# Altium footprint library smd-ipc.PCBLIB: 363 footprints (part 12 of 27)
Each footprint in its own frame and in the unit in brackets; x right, y up, seen from the top. Pads: shape width x height; smd on the part's side, far side on the other; paste and mask are expansions set on the pad; w line width, h text height; cw(c..) or ccw(c..) is an arc to the next point about the centre after c.
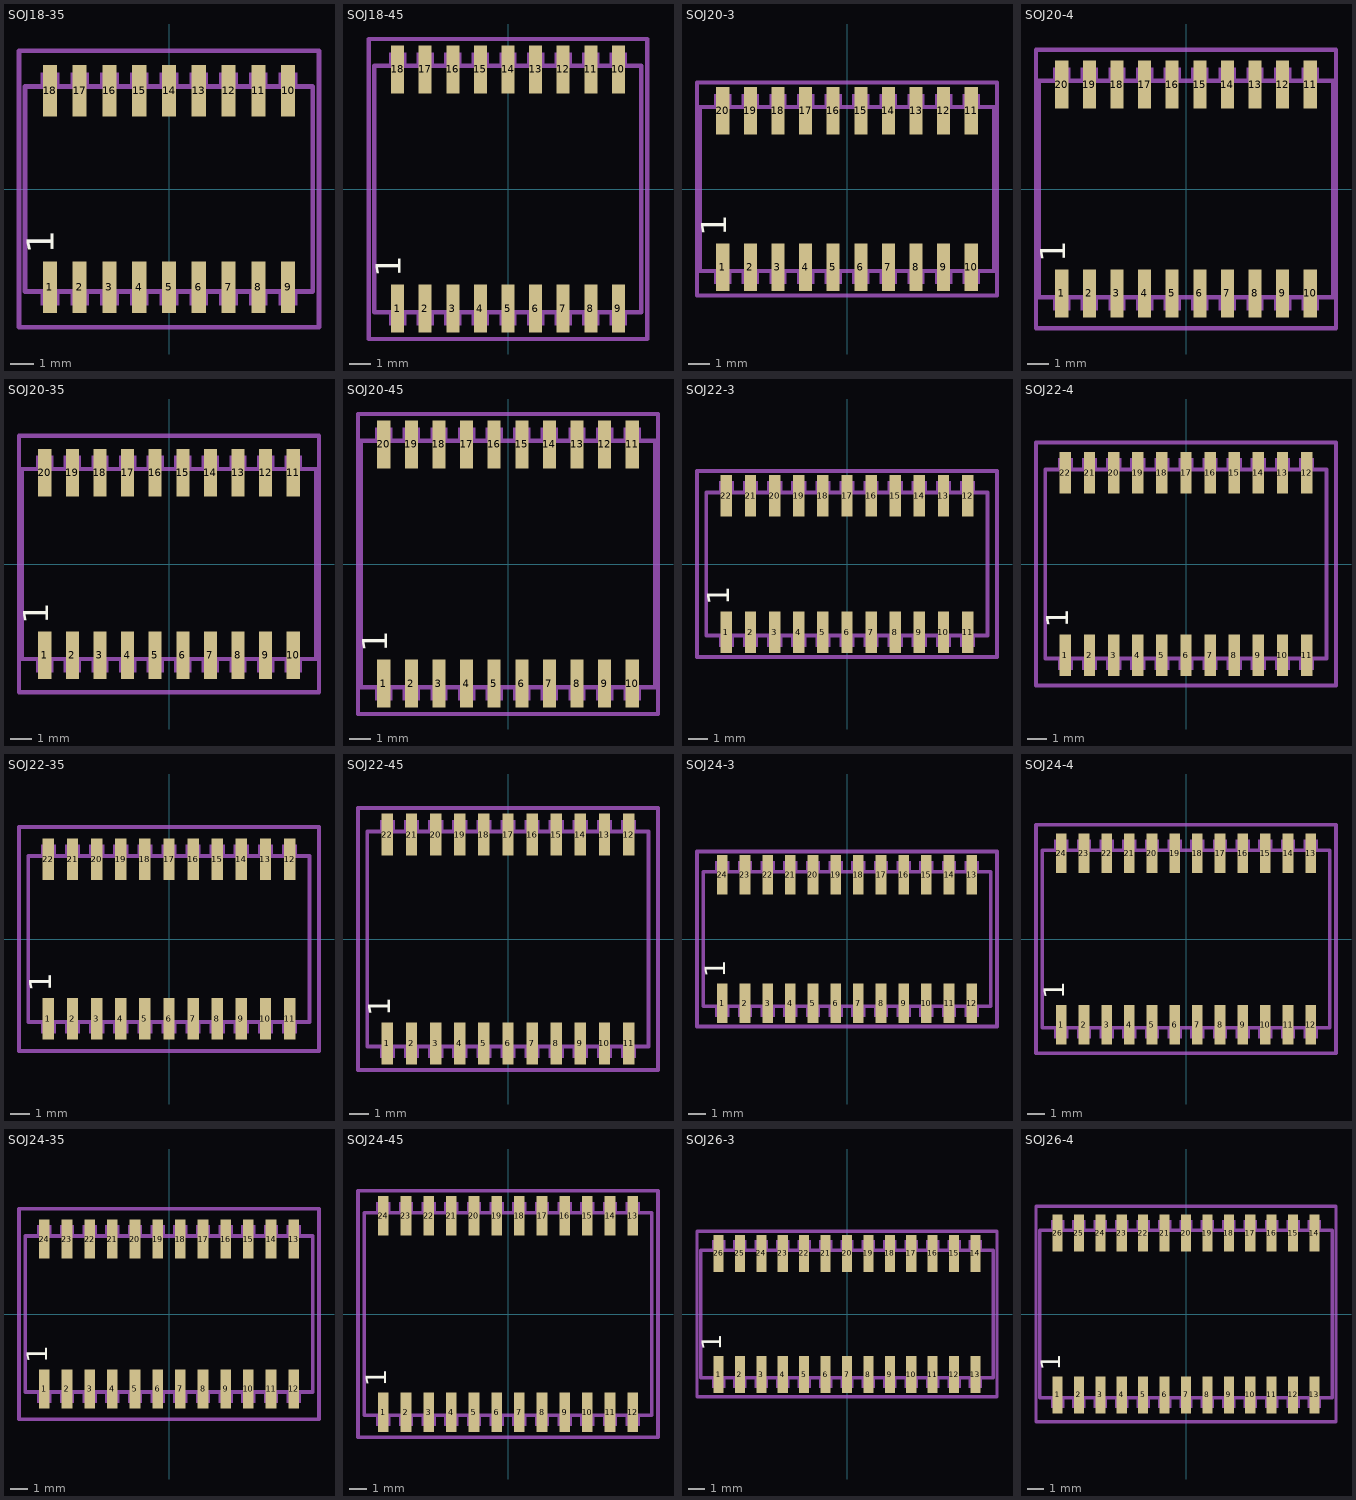
[diagram p11: the footprints below, top view; thin cyan lines are the x and y axes]

## SOJ18-35 [mm]
pads (18):
  rect 0.6x2.2 smd: 1(-5.08,-4.2) 2(-3.81,-4.2) 3(-2.54,-4.2) 4(-1.27,-4.2) 5(0,-4.2) 6(1.27,-4.2) 7(2.54,-4.2) 8(3.81,-4.2) 9(5.08,-4.2) 10(5.08,4.2) 11(3.81,4.2) 12(2.54,4.2) 13(1.27,4.2) 14(0,4.2) 15(-1.27,4.2) 16(-2.54,4.2) 17(-3.81,4.2) 18(-5.08,4.2)
Top Overlay:
  text "1" at -4.535,-2.77 h1.97
Mechanical 16:
  rectangle: -5.33,-4.27 -4.83,-3.13
  rectangle: -5.48,-4.98 -4.68,-4.47
  rectangle: -4.06,-4.27 -3.56,-3.13
  rectangle: -4.21,-4.98 -3.41,-4.47
  rectangle: -2.79,-4.27 -2.29,-3.13
  rectangle: -2.94,-4.98 -2.14,-4.47
  rectangle: -1.52,-4.27 -1.02,-3.13
  rectangle: -1.67,-4.98 -0.87,-4.47
  rectangle: -0.25,-4.27 0.25,-3.13
  rectangle: -0.4,-4.98 0.4,-4.47
  rectangle: 1.02,-4.27 1.52,-3.13
  rectangle: 0.87,-4.98 1.67,-4.47
  rectangle: 2.29,-4.27 2.79,-3.13
  rectangle: 2.14,-4.98 2.94,-4.47
  rectangle: 3.56,-4.27 4.06,-3.13
  rectangle: 3.41,-4.98 4.21,-4.47
  rectangle: 4.83,-4.27 5.33,-3.13
  rectangle: 4.68,-4.98 5.48,-4.47
  rectangle: 4.83,3.13 5.33,4.27
  rectangle: 4.68,4.47 5.48,4.98
  rectangle: 3.56,3.13 4.06,4.27
  rectangle: 3.41,4.47 4.21,4.98
  rectangle: 2.29,3.13 2.79,4.27
  rectangle: 2.14,4.47 2.94,4.98
  rectangle: 1.02,3.13 1.52,4.27
  rectangle: 0.87,4.47 1.67,4.98
  rectangle: -0.25,3.13 0.25,4.27
  rectangle: -0.4,4.47 0.4,4.98
  rectangle: -1.52,3.13 -1.02,4.27
  rectangle: -1.67,4.47 -0.87,4.98
  rectangle: -2.79,3.13 -2.29,4.27
  rectangle: -2.94,4.47 -2.14,4.98
  rectangle: -4.06,3.13 -3.56,4.27
  rectangle: -4.21,4.47 -3.41,4.98
  rectangle: -5.33,3.13 -4.83,4.27
  rectangle: -5.48,4.47 -4.68,4.98
  lines w0.203: -6.145,-4.37 6.135,-4.37 6.135,4.37 -6.145,4.37 -6.145,-4.37
Mechanical 27:
  lines w0.2: -6.4,-5.9 -6.4,5.9 6.4,5.9 6.4,-5.9 -6.4,-5.9

## SOJ18-45 [mm]
pads (18):
  rect 0.6x2.2 smd: 1(-5.08,-5.5) 2(-3.81,-5.5) 3(-2.54,-5.5) 4(-1.27,-5.5) 5(0,-5.5) 6(1.27,-5.5) 7(2.54,-5.5) 8(3.81,-5.5) 9(5.08,-5.5) 10(5.08,5.5) 11(3.81,5.5) 12(2.54,5.5) 13(1.27,5.5) 14(0,5.5) 15(-1.27,5.5) 16(-2.54,5.5) 17(-3.81,5.5) 18(-5.08,5.5)
Top Overlay:
  text "1" at -4.535,-4.07 h1.97
Mechanical 16:
  rectangle: -5.33,-5.57 -4.83,-4.43
  rectangle: -5.48,-6.28 -4.68,-5.77
  rectangle: -4.06,-5.57 -3.56,-4.43
  rectangle: -4.21,-6.28 -3.41,-5.77
  rectangle: -2.79,-5.57 -2.29,-4.43
  rectangle: -2.94,-6.28 -2.14,-5.77
  rectangle: -1.52,-5.57 -1.02,-4.43
  rectangle: -1.67,-6.28 -0.87,-5.77
  rectangle: -0.25,-5.57 0.25,-4.43
  rectangle: -0.4,-6.28 0.4,-5.77
  rectangle: 1.02,-5.57 1.52,-4.43
  rectangle: 0.87,-6.28 1.67,-5.77
  rectangle: 2.29,-5.57 2.79,-4.43
  rectangle: 2.14,-6.28 2.94,-5.77
  rectangle: 3.56,-5.57 4.06,-4.43
  rectangle: 3.41,-6.28 4.21,-5.77
  rectangle: 4.83,-5.57 5.33,-4.43
  rectangle: 4.68,-6.28 5.48,-5.77
  rectangle: 4.83,4.43 5.33,5.57
  rectangle: 4.68,5.77 5.48,6.28
  rectangle: 3.56,4.43 4.06,5.57
  rectangle: 3.41,5.77 4.21,6.28
  rectangle: 2.29,4.43 2.79,5.57
  rectangle: 2.14,5.77 2.94,6.28
  rectangle: 1.02,4.43 1.52,5.57
  rectangle: 0.87,5.77 1.67,6.28
  rectangle: -0.25,4.43 0.25,5.57
  rectangle: -0.4,5.77 0.4,6.28
  rectangle: -1.52,4.43 -1.02,5.57
  rectangle: -1.67,5.77 -0.87,6.28
  rectangle: -2.79,4.43 -2.29,5.57
  rectangle: -2.94,5.77 -2.14,6.28
  rectangle: -4.06,4.43 -3.56,5.57
  rectangle: -4.21,5.77 -3.41,6.28
  rectangle: -5.33,4.43 -4.83,5.57
  rectangle: -5.48,5.77 -4.68,6.28
  lines w0.203: -6.145,-5.67 6.135,-5.67 6.135,5.67 -6.145,5.67 -6.145,-5.67
Mechanical 27:
  lines w0.2: -6.4,-6.9 -6.4,6.9 6.4,6.9 6.4,-6.9 -6.4,-6.9

## SOJ20-3 [mm]
pads (20):
  rect 0.6x2.2 smd: 1(-5.715,-3.6) 2(-4.445,-3.6) 3(-3.175,-3.6) 4(-1.905,-3.6) 5(-0.635,-3.6) 6(0.635,-3.6) 7(1.905,-3.6) 8(3.175,-3.6) 9(4.445,-3.6) 10(5.715,-3.6) 11(5.715,3.6) 12(4.445,3.6) 13(3.175,3.6) 14(1.905,3.6) 15(0.635,3.6) 16(-0.635,3.6) 17(-1.905,3.6) 18(-3.175,3.6) 19(-4.445,3.6) 20(-5.715,3.6)
Top Overlay:
  text "1" at -5.17,-2.17 h1.97
Mechanical 16:
  rectangle: -5.965,-3.67 -5.465,-2.53
  rectangle: -6.115,-4.38 -5.315,-3.87
  rectangle: -4.695,-3.67 -4.195,-2.53
  rectangle: -4.845,-4.38 -4.045,-3.87
  rectangle: -3.425,-3.67 -2.925,-2.53
  rectangle: -3.575,-4.38 -2.775,-3.87
  rectangle: -2.155,-3.67 -1.655,-2.53
  rectangle: -2.305,-4.38 -1.505,-3.87
  rectangle: -0.885,-3.67 -0.385,-2.53
  rectangle: -1.035,-4.38 -0.235,-3.87
  rectangle: 0.385,-3.67 0.885,-2.53
  rectangle: 0.235,-4.38 1.035,-3.87
  rectangle: 1.655,-3.67 2.155,-2.53
  rectangle: 1.505,-4.38 2.305,-3.87
  rectangle: 2.925,-3.67 3.425,-2.53
  rectangle: 2.775,-4.38 3.575,-3.87
  rectangle: 4.195,-3.67 4.695,-2.53
  rectangle: 4.045,-4.38 4.845,-3.87
  rectangle: 5.465,-3.67 5.965,-2.53
  rectangle: 5.315,-4.38 6.115,-3.87
  rectangle: 5.465,2.53 5.965,3.67
  rectangle: 5.315,3.87 6.115,4.38
  rectangle: 4.195,2.53 4.695,3.67
  rectangle: 4.045,3.87 4.845,4.38
  rectangle: 2.925,2.53 3.425,3.67
  rectangle: 2.775,3.87 3.575,4.38
  rectangle: 1.655,2.53 2.155,3.67
  rectangle: 1.505,3.87 2.305,4.38
  rectangle: 0.385,2.53 0.885,3.67
  rectangle: 0.235,3.87 1.035,4.38
  rectangle: -0.885,2.53 -0.385,3.67
  rectangle: -1.035,3.87 -0.235,4.38
  rectangle: -2.155,2.53 -1.655,3.67
  rectangle: -2.305,3.87 -1.505,4.38
  rectangle: -3.425,2.53 -2.925,3.67
  rectangle: -3.575,3.87 -2.775,4.38
  rectangle: -4.695,2.53 -4.195,3.67
  rectangle: -4.845,3.87 -4.045,4.38
  rectangle: -5.965,2.53 -5.465,3.67
  rectangle: -6.115,3.87 -5.315,4.38
  lines w0.203: -6.78,-3.77 6.77,-3.77 6.77,3.77 -6.78,3.77 -6.78,-3.77
Mechanical 27:
  lines w0.2: -6.9,-4.9 -6.9,4.9 6.9,4.9 6.9,-4.9 -6.9,-4.9

## SOJ20-4 [mm]
pads (20):
  rect 0.6x2.2 smd: 1(-5.715,-4.8) 2(-4.445,-4.8) 3(-3.175,-4.8) 4(-1.905,-4.8) 5(-0.635,-4.8) 6(0.635,-4.8) 7(1.905,-4.8) 8(3.175,-4.8) 9(4.445,-4.8) 10(5.715,-4.8) 11(5.715,4.8) 12(4.445,4.8) 13(3.175,4.8) 14(1.905,4.8) 15(0.635,4.8) 16(-0.635,4.8) 17(-1.905,4.8) 18(-3.175,4.8) 19(-4.445,4.8) 20(-5.715,4.8)
Top Overlay:
  text "1" at -5.17,-3.37 h1.97
Mechanical 16:
  rectangle: -5.965,-4.87 -5.465,-3.73
  rectangle: -6.115,-5.58 -5.315,-5.07
  rectangle: -4.695,-4.87 -4.195,-3.73
  rectangle: -4.845,-5.58 -4.045,-5.07
  rectangle: -3.425,-4.87 -2.925,-3.73
  rectangle: -3.575,-5.58 -2.775,-5.07
  rectangle: -2.155,-4.87 -1.655,-3.73
  rectangle: -2.305,-5.58 -1.505,-5.07
  rectangle: -0.885,-4.87 -0.385,-3.73
  rectangle: -1.035,-5.58 -0.235,-5.07
  rectangle: 0.385,-4.87 0.885,-3.73
  rectangle: 0.235,-5.58 1.035,-5.07
  rectangle: 1.655,-4.87 2.155,-3.73
  rectangle: 1.505,-5.58 2.305,-5.07
  rectangle: 2.925,-4.87 3.425,-3.73
  rectangle: 2.775,-5.58 3.575,-5.07
  rectangle: 4.195,-4.87 4.695,-3.73
  rectangle: 4.045,-5.58 4.845,-5.07
  rectangle: 5.465,-4.87 5.965,-3.73
  rectangle: 5.315,-5.58 6.115,-5.07
  rectangle: 5.465,3.73 5.965,4.87
  rectangle: 5.315,5.07 6.115,5.58
  rectangle: 4.195,3.73 4.695,4.87
  rectangle: 4.045,5.07 4.845,5.58
  rectangle: 2.925,3.73 3.425,4.87
  rectangle: 2.775,5.07 3.575,5.58
  rectangle: 1.655,3.73 2.155,4.87
  rectangle: 1.505,5.07 2.305,5.58
  rectangle: 0.385,3.73 0.885,4.87
  rectangle: 0.235,5.07 1.035,5.58
  rectangle: -0.885,3.73 -0.385,4.87
  rectangle: -1.035,5.07 -0.235,5.58
  rectangle: -2.155,3.73 -1.655,4.87
  rectangle: -2.305,5.07 -1.505,5.58
  rectangle: -3.425,3.73 -2.925,4.87
  rectangle: -3.575,5.07 -2.775,5.58
  rectangle: -4.695,3.73 -4.195,4.87
  rectangle: -4.845,5.07 -4.045,5.58
  rectangle: -5.965,3.73 -5.465,4.87
  rectangle: -6.115,5.07 -5.315,5.58
  lines w0.203: -6.78,-4.97 6.77,-4.97 6.77,4.97 -6.78,4.97 -6.78,-4.97
Mechanical 27:
  lines w0.2: -6.9,-6.4 -6.9,6.4 6.9,6.4 6.9,-6.4 -6.9,-6.4

## SOJ20-35 [mm]
pads (20):
  rect 0.6x2.2 smd: 1(-5.715,-4.2) 2(-4.445,-4.2) 3(-3.175,-4.2) 4(-1.905,-4.2) 5(-0.635,-4.2) 6(0.635,-4.2) 7(1.905,-4.2) 8(3.175,-4.2) 9(4.445,-4.2) 10(5.715,-4.2) 11(5.715,4.2) 12(4.445,4.2) 13(3.175,4.2) 14(1.905,4.2) 15(0.635,4.2) 16(-0.635,4.2) 17(-1.905,4.2) 18(-3.175,4.2) 19(-4.445,4.2) 20(-5.715,4.2)
Top Overlay:
  text "1" at -5.17,-2.77 h1.97
Mechanical 16:
  rectangle: -5.965,-4.27 -5.465,-3.13
  rectangle: -6.115,-4.98 -5.315,-4.47
  rectangle: -4.695,-4.27 -4.195,-3.13
  rectangle: -4.845,-4.98 -4.045,-4.47
  rectangle: -3.425,-4.27 -2.925,-3.13
  rectangle: -3.575,-4.98 -2.775,-4.47
  rectangle: -2.155,-4.27 -1.655,-3.13
  rectangle: -2.305,-4.98 -1.505,-4.47
  rectangle: -0.885,-4.27 -0.385,-3.13
  rectangle: -1.035,-4.98 -0.235,-4.47
  rectangle: 0.385,-4.27 0.885,-3.13
  rectangle: 0.235,-4.98 1.035,-4.47
  rectangle: 1.655,-4.27 2.155,-3.13
  rectangle: 1.505,-4.98 2.305,-4.47
  rectangle: 2.925,-4.27 3.425,-3.13
  rectangle: 2.775,-4.98 3.575,-4.47
  rectangle: 4.195,-4.27 4.695,-3.13
  rectangle: 4.045,-4.98 4.845,-4.47
  rectangle: 5.465,-4.27 5.965,-3.13
  rectangle: 5.315,-4.98 6.115,-4.47
  rectangle: 5.465,3.13 5.965,4.27
  rectangle: 5.315,4.47 6.115,4.98
  rectangle: 4.195,3.13 4.695,4.27
  rectangle: 4.045,4.47 4.845,4.98
  rectangle: 2.925,3.13 3.425,4.27
  rectangle: 2.775,4.47 3.575,4.98
  rectangle: 1.655,3.13 2.155,4.27
  rectangle: 1.505,4.47 2.305,4.98
  rectangle: 0.385,3.13 0.885,4.27
  rectangle: 0.235,4.47 1.035,4.98
  rectangle: -0.885,3.13 -0.385,4.27
  rectangle: -1.035,4.47 -0.235,4.98
  rectangle: -2.155,3.13 -1.655,4.27
  rectangle: -2.305,4.47 -1.505,4.98
  rectangle: -3.425,3.13 -2.925,4.27
  rectangle: -3.575,4.47 -2.775,4.98
  rectangle: -4.695,3.13 -4.195,4.27
  rectangle: -4.845,4.47 -4.045,4.98
  rectangle: -5.965,3.13 -5.465,4.27
  rectangle: -6.115,4.47 -5.315,4.98
  lines w0.203: -6.78,-4.37 6.77,-4.37 6.77,4.37 -6.78,4.37 -6.78,-4.37
Mechanical 27:
  lines w0.2: -6.9,-5.9 -6.9,5.9 6.9,5.9 6.9,-5.9 -6.9,-5.9

## SOJ20-45 [mm]
pads (20):
  rect 0.6x2.2 smd: 1(-5.715,-5.5) 2(-4.445,-5.5) 3(-3.175,-5.5) 4(-1.905,-5.5) 5(-0.635,-5.5) 6(0.635,-5.5) 7(1.905,-5.5) 8(3.175,-5.5) 9(4.445,-5.5) 10(5.715,-5.5) 11(5.715,5.5) 12(4.445,5.5) 13(3.175,5.5) 14(1.905,5.5) 15(0.635,5.5) 16(-0.635,5.5) 17(-1.905,5.5) 18(-3.175,5.5) 19(-4.445,5.5) 20(-5.715,5.5)
Top Overlay:
  text "1" at -5.17,-4.07 h1.97
Mechanical 16:
  rectangle: -5.965,-5.57 -5.465,-4.43
  rectangle: -6.115,-6.28 -5.315,-5.77
  rectangle: -4.695,-5.57 -4.195,-4.43
  rectangle: -4.845,-6.28 -4.045,-5.77
  rectangle: -3.425,-5.57 -2.925,-4.43
  rectangle: -3.575,-6.28 -2.775,-5.77
  rectangle: -2.155,-5.57 -1.655,-4.43
  rectangle: -2.305,-6.28 -1.505,-5.77
  rectangle: -0.885,-5.57 -0.385,-4.43
  rectangle: -1.035,-6.28 -0.235,-5.77
  rectangle: 0.385,-5.57 0.885,-4.43
  rectangle: 0.235,-6.28 1.035,-5.77
  rectangle: 1.655,-5.57 2.155,-4.43
  rectangle: 1.505,-6.28 2.305,-5.77
  rectangle: 2.925,-5.57 3.425,-4.43
  rectangle: 2.775,-6.28 3.575,-5.77
  rectangle: 4.195,-5.57 4.695,-4.43
  rectangle: 4.045,-6.28 4.845,-5.77
  rectangle: 5.465,-5.57 5.965,-4.43
  rectangle: 5.315,-6.28 6.115,-5.77
  rectangle: 5.465,4.43 5.965,5.57
  rectangle: 5.315,5.77 6.115,6.28
  rectangle: 4.195,4.43 4.695,5.57
  rectangle: 4.045,5.77 4.845,6.28
  rectangle: 2.925,4.43 3.425,5.57
  rectangle: 2.775,5.77 3.575,6.28
  rectangle: 1.655,4.43 2.155,5.57
  rectangle: 1.505,5.77 2.305,6.28
  rectangle: 0.385,4.43 0.885,5.57
  rectangle: 0.235,5.77 1.035,6.28
  rectangle: -0.885,4.43 -0.385,5.57
  rectangle: -1.035,5.77 -0.235,6.28
  rectangle: -2.155,4.43 -1.655,5.57
  rectangle: -2.305,5.77 -1.505,6.28
  rectangle: -3.425,4.43 -2.925,5.57
  rectangle: -3.575,5.77 -2.775,6.28
  rectangle: -4.695,4.43 -4.195,5.57
  rectangle: -4.845,5.77 -4.045,6.28
  rectangle: -5.965,4.43 -5.465,5.57
  rectangle: -6.115,5.77 -5.315,6.28
  lines w0.203: -6.78,-5.67 6.77,-5.67 6.77,5.67 -6.78,5.67 -6.78,-5.67
Mechanical 27:
  lines w0.2: -6.9,-6.9 -6.9,6.9 6.9,6.9 6.9,-6.9 -6.9,-6.9

## SOJ22-3 [mm]
pads (22):
  rect 0.6x2.2 smd: 1(-6.35,-3.6) 2(-5.08,-3.6) 3(-3.81,-3.6) 4(-2.54,-3.6) 5(-1.27,-3.6) 6(0,-3.6) 7(1.27,-3.6) 8(2.54,-3.6) 9(3.81,-3.6) 10(5.08,-3.6) 11(6.35,-3.6) 12(6.35,3.6) 13(5.08,3.6) 14(3.81,3.6) 15(2.54,3.6) 16(1.27,3.6) 17(0,3.6) 18(-1.27,3.6) 19(-2.54,3.6) 20(-3.81,3.6) 21(-5.08,3.6) 22(-6.35,3.6)
Top Overlay:
  text "1" at -5.805,-2.17 h1.97
Mechanical 16:
  rectangle: -6.6,-3.67 -6.1,-2.53
  rectangle: -6.75,-4.38 -5.95,-3.87
  rectangle: -5.33,-3.67 -4.83,-2.53
  rectangle: -5.48,-4.38 -4.68,-3.87
  rectangle: -4.06,-3.67 -3.56,-2.53
  rectangle: -4.21,-4.38 -3.41,-3.87
  rectangle: -2.79,-3.67 -2.29,-2.53
  rectangle: -2.94,-4.38 -2.14,-3.87
  rectangle: -1.52,-3.67 -1.02,-2.53
  rectangle: -1.67,-4.38 -0.87,-3.87
  rectangle: -0.25,-3.67 0.25,-2.53
  rectangle: -0.4,-4.38 0.4,-3.87
  rectangle: 1.02,-3.67 1.52,-2.53
  rectangle: 0.87,-4.38 1.67,-3.87
  rectangle: 2.29,-3.67 2.79,-2.53
  rectangle: 2.14,-4.38 2.94,-3.87
  rectangle: 3.56,-3.67 4.06,-2.53
  rectangle: 3.41,-4.38 4.21,-3.87
  rectangle: 4.83,-3.67 5.33,-2.53
  rectangle: 4.68,-4.38 5.48,-3.87
  rectangle: 6.1,-3.67 6.6,-2.53
  rectangle: 5.95,-4.38 6.75,-3.87
  rectangle: 6.1,2.53 6.6,3.67
  rectangle: 5.95,3.87 6.75,4.38
  rectangle: 4.83,2.53 5.33,3.67
  rectangle: 4.68,3.87 5.48,4.38
  rectangle: 3.56,2.53 4.06,3.67
  rectangle: 3.41,3.87 4.21,4.38
  rectangle: 2.29,2.53 2.79,3.67
  rectangle: 2.14,3.87 2.94,4.38
  rectangle: 1.02,2.53 1.52,3.67
  rectangle: 0.87,3.87 1.67,4.38
  rectangle: -0.25,2.53 0.25,3.67
  rectangle: -0.4,3.87 0.4,4.38
  rectangle: -1.52,2.53 -1.02,3.67
  rectangle: -1.67,3.87 -0.87,4.38
  rectangle: -2.79,2.53 -2.29,3.67
  rectangle: -2.94,3.87 -2.14,4.38
  rectangle: -4.06,2.53 -3.56,3.67
  rectangle: -4.21,3.87 -3.41,4.38
  rectangle: -5.33,2.53 -4.83,3.67
  rectangle: -5.48,3.87 -4.68,4.38
  rectangle: -6.6,2.53 -6.1,3.67
  rectangle: -6.75,3.87 -5.95,4.38
  lines w0.203: -7.415,-3.77 7.405,-3.77 7.405,3.77 -7.415,3.77 -7.415,-3.77
Mechanical 27:
  lines w0.2: -7.9,-4.9 -7.9,4.9 7.9,4.9 7.9,-4.9 -7.9,-4.9

## SOJ22-4 [mm]
pads (22):
  rect 0.6x2.2 smd: 1(-6.35,-4.8) 2(-5.08,-4.8) 3(-3.81,-4.8) 4(-2.54,-4.8) 5(-1.27,-4.8) 6(0,-4.8) 7(1.27,-4.8) 8(2.54,-4.8) 9(3.81,-4.8) 10(5.08,-4.8) 11(6.35,-4.8) 12(6.35,4.8) 13(5.08,4.8) 14(3.81,4.8) 15(2.54,4.8) 16(1.27,4.8) 17(0,4.8) 18(-1.27,4.8) 19(-2.54,4.8) 20(-3.81,4.8) 21(-5.08,4.8) 22(-6.35,4.8)
Top Overlay:
  text "1" at -5.805,-3.37 h1.97
Mechanical 16:
  rectangle: -6.6,-4.87 -6.1,-3.73
  rectangle: -6.75,-5.58 -5.95,-5.07
  rectangle: -5.33,-4.87 -4.83,-3.73
  rectangle: -5.48,-5.58 -4.68,-5.07
  rectangle: -4.06,-4.87 -3.56,-3.73
  rectangle: -4.21,-5.58 -3.41,-5.07
  rectangle: -2.79,-4.87 -2.29,-3.73
  rectangle: -2.94,-5.58 -2.14,-5.07
  rectangle: -1.52,-4.87 -1.02,-3.73
  rectangle: -1.67,-5.58 -0.87,-5.07
  rectangle: -0.25,-4.87 0.25,-3.73
  rectangle: -0.4,-5.58 0.4,-5.07
  rectangle: 1.02,-4.87 1.52,-3.73
  rectangle: 0.87,-5.58 1.67,-5.07
  rectangle: 2.29,-4.87 2.79,-3.73
  rectangle: 2.14,-5.58 2.94,-5.07
  rectangle: 3.56,-4.87 4.06,-3.73
  rectangle: 3.41,-5.58 4.21,-5.07
  rectangle: 4.83,-4.87 5.33,-3.73
  rectangle: 4.68,-5.58 5.48,-5.07
  rectangle: 6.1,-4.87 6.6,-3.73
  rectangle: 5.95,-5.58 6.75,-5.07
  rectangle: 6.1,3.73 6.6,4.87
  rectangle: 5.95,5.07 6.75,5.58
  rectangle: 4.83,3.73 5.33,4.87
  rectangle: 4.68,5.07 5.48,5.58
  rectangle: 3.56,3.73 4.06,4.87
  rectangle: 3.41,5.07 4.21,5.58
  rectangle: 2.29,3.73 2.79,4.87
  rectangle: 2.14,5.07 2.94,5.58
  rectangle: 1.02,3.73 1.52,4.87
  rectangle: 0.87,5.07 1.67,5.58
  rectangle: -0.25,3.73 0.25,4.87
  rectangle: -0.4,5.07 0.4,5.58
  rectangle: -1.52,3.73 -1.02,4.87
  rectangle: -1.67,5.07 -0.87,5.58
  rectangle: -2.79,3.73 -2.29,4.87
  rectangle: -2.94,5.07 -2.14,5.58
  rectangle: -4.06,3.73 -3.56,4.87
  rectangle: -4.21,5.07 -3.41,5.58
  rectangle: -5.33,3.73 -4.83,4.87
  rectangle: -5.48,5.07 -4.68,5.58
  rectangle: -6.6,3.73 -6.1,4.87
  rectangle: -6.75,5.07 -5.95,5.58
  lines w0.203: -7.415,-4.97 7.405,-4.97 7.405,4.97 -7.415,4.97 -7.415,-4.97
Mechanical 27:
  lines w0.2: -7.9,-6.4 -7.9,6.4 7.9,6.4 7.9,-6.4 -7.9,-6.4

## SOJ22-35 [mm]
pads (22):
  rect 0.6x2.2 smd: 1(-6.35,-4.2) 2(-5.08,-4.2) 3(-3.81,-4.2) 4(-2.54,-4.2) 5(-1.27,-4.2) 6(0,-4.2) 7(1.27,-4.2) 8(2.54,-4.2) 9(3.81,-4.2) 10(5.08,-4.2) 11(6.35,-4.2) 12(6.35,4.2) 13(5.08,4.2) 14(3.81,4.2) 15(2.54,4.2) 16(1.27,4.2) 17(0,4.2) 18(-1.27,4.2) 19(-2.54,4.2) 20(-3.81,4.2) 21(-5.08,4.2) 22(-6.35,4.2)
Top Overlay:
  text "1" at -5.805,-2.77 h1.97
Mechanical 16:
  rectangle: -6.6,-4.27 -6.1,-3.13
  rectangle: -6.75,-4.98 -5.95,-4.47
  rectangle: -5.33,-4.27 -4.83,-3.13
  rectangle: -5.48,-4.98 -4.68,-4.47
  rectangle: -4.06,-4.27 -3.56,-3.13
  rectangle: -4.21,-4.98 -3.41,-4.47
  rectangle: -2.79,-4.27 -2.29,-3.13
  rectangle: -2.94,-4.98 -2.14,-4.47
  rectangle: -1.52,-4.27 -1.02,-3.13
  rectangle: -1.67,-4.98 -0.87,-4.47
  rectangle: -0.25,-4.27 0.25,-3.13
  rectangle: -0.4,-4.98 0.4,-4.47
  rectangle: 1.02,-4.27 1.52,-3.13
  rectangle: 0.87,-4.98 1.67,-4.47
  rectangle: 2.29,-4.27 2.79,-3.13
  rectangle: 2.14,-4.98 2.94,-4.47
  rectangle: 3.56,-4.27 4.06,-3.13
  rectangle: 3.41,-4.98 4.21,-4.47
  rectangle: 4.83,-4.27 5.33,-3.13
  rectangle: 4.68,-4.98 5.48,-4.47
  rectangle: 6.1,-4.27 6.6,-3.13
  rectangle: 5.95,-4.98 6.75,-4.47
  rectangle: 6.1,3.13 6.6,4.27
  rectangle: 5.95,4.47 6.75,4.98
  rectangle: 4.83,3.13 5.33,4.27
  rectangle: 4.68,4.47 5.48,4.98
  rectangle: 3.56,3.13 4.06,4.27
  rectangle: 3.41,4.47 4.21,4.98
  rectangle: 2.29,3.13 2.79,4.27
  rectangle: 2.14,4.47 2.94,4.98
  rectangle: 1.02,3.13 1.52,4.27
  rectangle: 0.87,4.47 1.67,4.98
  rectangle: -0.25,3.13 0.25,4.27
  rectangle: -0.4,4.47 0.4,4.98
  rectangle: -1.52,3.13 -1.02,4.27
  rectangle: -1.67,4.47 -0.87,4.98
  rectangle: -2.79,3.13 -2.29,4.27
  rectangle: -2.94,4.47 -2.14,4.98
  rectangle: -4.06,3.13 -3.56,4.27
  rectangle: -4.21,4.47 -3.41,4.98
  rectangle: -5.33,3.13 -4.83,4.27
  rectangle: -5.48,4.47 -4.68,4.98
  rectangle: -6.6,3.13 -6.1,4.27
  rectangle: -6.75,4.47 -5.95,4.98
  lines w0.203: -7.415,-4.37 7.405,-4.37 7.405,4.37 -7.415,4.37 -7.415,-4.37
Mechanical 27:
  lines w0.2: -7.9,-5.9 -7.9,5.9 7.9,5.9 7.9,-5.9 -7.9,-5.9

## SOJ22-45 [mm]
pads (22):
  rect 0.6x2.2 smd: 1(-6.35,-5.5) 2(-5.08,-5.5) 3(-3.81,-5.5) 4(-2.54,-5.5) 5(-1.27,-5.5) 6(0,-5.5) 7(1.27,-5.5) 8(2.54,-5.5) 9(3.81,-5.5) 10(5.08,-5.5) 11(6.35,-5.5) 12(6.35,5.5) 13(5.08,5.5) 14(3.81,5.5) 15(2.54,5.5) 16(1.27,5.5) 17(0,5.5) 18(-1.27,5.5) 19(-2.54,5.5) 20(-3.81,5.5) 21(-5.08,5.5) 22(-6.35,5.5)
Top Overlay:
  text "1" at -5.805,-4.07 h1.97
Mechanical 16:
  rectangle: -6.6,-5.57 -6.1,-4.43
  rectangle: -6.75,-6.28 -5.95,-5.77
  rectangle: -5.33,-5.57 -4.83,-4.43
  rectangle: -5.48,-6.28 -4.68,-5.77
  rectangle: -4.06,-5.57 -3.56,-4.43
  rectangle: -4.21,-6.28 -3.41,-5.77
  rectangle: -2.79,-5.57 -2.29,-4.43
  rectangle: -2.94,-6.28 -2.14,-5.77
  rectangle: -1.52,-5.57 -1.02,-4.43
  rectangle: -1.67,-6.28 -0.87,-5.77
  rectangle: -0.25,-5.57 0.25,-4.43
  rectangle: -0.4,-6.28 0.4,-5.77
  rectangle: 1.02,-5.57 1.52,-4.43
  rectangle: 0.87,-6.28 1.67,-5.77
  rectangle: 2.29,-5.57 2.79,-4.43
  rectangle: 2.14,-6.28 2.94,-5.77
  rectangle: 3.56,-5.57 4.06,-4.43
  rectangle: 3.41,-6.28 4.21,-5.77
  rectangle: 4.83,-5.57 5.33,-4.43
  rectangle: 4.68,-6.28 5.48,-5.77
  rectangle: 6.1,-5.57 6.6,-4.43
  rectangle: 5.95,-6.28 6.75,-5.77
  rectangle: 6.1,4.43 6.6,5.57
  rectangle: 5.95,5.77 6.75,6.28
  rectangle: 4.83,4.43 5.33,5.57
  rectangle: 4.68,5.77 5.48,6.28
  rectangle: 3.56,4.43 4.06,5.57
  rectangle: 3.41,5.77 4.21,6.28
  rectangle: 2.29,4.43 2.79,5.57
  rectangle: 2.14,5.77 2.94,6.28
  rectangle: 1.02,4.43 1.52,5.57
  rectangle: 0.87,5.77 1.67,6.28
  rectangle: -0.25,4.43 0.25,5.57
  rectangle: -0.4,5.77 0.4,6.28
  rectangle: -1.52,4.43 -1.02,5.57
  rectangle: -1.67,5.77 -0.87,6.28
  rectangle: -2.79,4.43 -2.29,5.57
  rectangle: -2.94,5.77 -2.14,6.28
  rectangle: -4.06,4.43 -3.56,5.57
  rectangle: -4.21,5.77 -3.41,6.28
  rectangle: -5.33,4.43 -4.83,5.57
  rectangle: -5.48,5.77 -4.68,6.28
  rectangle: -6.6,4.43 -6.1,5.57
  rectangle: -6.75,5.77 -5.95,6.28
  lines w0.203: -7.415,-5.67 7.405,-5.67 7.405,5.67 -7.415,5.67 -7.415,-5.67
Mechanical 27:
  lines w0.2: -7.9,-6.9 -7.9,6.9 7.9,6.9 7.9,-6.9 -7.9,-6.9

## SOJ24-3 [mm]
pads (24):
  rect 0.6x2.2 smd: 1(-6.985,-3.6) 2(-5.715,-3.6) 3(-4.445,-3.6) 4(-3.175,-3.6) 5(-1.905,-3.6) 6(-0.635,-3.6) 7(0.635,-3.6) 8(1.905,-3.6) 9(3.175,-3.6) 10(4.445,-3.6) 11(5.715,-3.6) 12(6.985,-3.6) 13(6.985,3.6) 14(5.715,3.6) 15(4.445,3.6) 16(3.175,3.6) 17(1.905,3.6) 18(0.635,3.6) 19(-0.635,3.6) 20(-1.905,3.6) 21(-3.175,3.6) 22(-4.445,3.6) 23(-5.715,3.6) 24(-6.985,3.6)
Top Overlay:
  text "1" at -6.44,-2.17 h1.97
Mechanical 16:
  rectangle: -7.235,-3.67 -6.735,-2.53
  rectangle: -7.385,-4.38 -6.585,-3.87
  rectangle: -5.965,-3.67 -5.465,-2.53
  rectangle: -6.115,-4.38 -5.315,-3.87
  rectangle: -4.695,-3.67 -4.195,-2.53
  rectangle: -4.845,-4.38 -4.045,-3.87
  rectangle: -3.425,-3.67 -2.925,-2.53
  rectangle: -3.575,-4.38 -2.775,-3.87
  rectangle: -2.155,-3.67 -1.655,-2.53
  rectangle: -2.305,-4.38 -1.505,-3.87
  rectangle: -0.885,-3.67 -0.385,-2.53
  rectangle: -1.035,-4.38 -0.235,-3.87
  rectangle: 0.385,-3.67 0.885,-2.53
  rectangle: 0.235,-4.38 1.035,-3.87
  rectangle: 1.655,-3.67 2.155,-2.53
  rectangle: 1.505,-4.38 2.305,-3.87
  rectangle: 2.925,-3.67 3.425,-2.53
  rectangle: 2.775,-4.38 3.575,-3.87
  rectangle: 4.195,-3.67 4.695,-2.53
  rectangle: 4.045,-4.38 4.845,-3.87
  rectangle: 5.465,-3.67 5.965,-2.53
  rectangle: 5.315,-4.38 6.115,-3.87
  rectangle: 6.735,-3.67 7.235,-2.53
  rectangle: 6.585,-4.38 7.385,-3.87
  rectangle: 6.735,2.53 7.235,3.67
  rectangle: 6.585,3.87 7.385,4.38
  rectangle: 5.465,2.53 5.965,3.67
  rectangle: 5.315,3.87 6.115,4.38
  rectangle: 4.195,2.53 4.695,3.67
  rectangle: 4.045,3.87 4.845,4.38
  rectangle: 2.925,2.53 3.425,3.67
  rectangle: 2.775,3.87 3.575,4.38
  rectangle: 1.655,2.53 2.155,3.67
  rectangle: 1.505,3.87 2.305,4.38
  rectangle: 0.385,2.53 0.885,3.67
  rectangle: 0.235,3.87 1.035,4.38
  rectangle: -0.885,2.53 -0.385,3.67
  rectangle: -1.035,3.87 -0.235,4.38
  rectangle: -2.155,2.53 -1.655,3.67
  rectangle: -2.305,3.87 -1.505,4.38
  rectangle: -3.425,2.53 -2.925,3.67
  rectangle: -3.575,3.87 -2.775,4.38
  rectangle: -4.695,2.53 -4.195,3.67
  rectangle: -4.845,3.87 -4.045,4.38
  rectangle: -5.965,2.53 -5.465,3.67
  rectangle: -6.115,3.87 -5.315,4.38
  rectangle: -7.235,2.53 -6.735,3.67
  rectangle: -7.385,3.87 -6.585,4.38
  lines w0.203: -8.05,-3.77 8.04,-3.77 8.04,3.77 -8.05,3.77 -8.05,-3.77
Mechanical 27:
  lines w0.2: -8.4,-4.9 -8.4,4.9 8.4,4.9 8.4,-4.9 -8.4,-4.9

## SOJ24-4 [mm]
pads (24):
  rect 0.6x2.2 smd: 1(-6.985,-4.8) 2(-5.715,-4.8) 3(-4.445,-4.8) 4(-3.175,-4.8) 5(-1.905,-4.8) 6(-0.635,-4.8) 7(0.635,-4.8) 8(1.905,-4.8) 9(3.175,-4.8) 10(4.445,-4.8) 11(5.715,-4.8) 12(6.985,-4.8) 13(6.985,4.8) 14(5.715,4.8) 15(4.445,4.8) 16(3.175,4.8) 17(1.905,4.8) 18(0.635,4.8) 19(-0.635,4.8) 20(-1.905,4.8) 21(-3.175,4.8) 22(-4.445,4.8) 23(-5.715,4.8) 24(-6.985,4.8)
Top Overlay:
  text "1" at -6.44,-3.37 h1.97
Mechanical 16:
  rectangle: -7.235,-4.87 -6.735,-3.73
  rectangle: -7.385,-5.58 -6.585,-5.07
  rectangle: -5.965,-4.87 -5.465,-3.73
  rectangle: -6.115,-5.58 -5.315,-5.07
  rectangle: -4.695,-4.87 -4.195,-3.73
  rectangle: -4.845,-5.58 -4.045,-5.07
  rectangle: -3.425,-4.87 -2.925,-3.73
  rectangle: -3.575,-5.58 -2.775,-5.07
  rectangle: -2.155,-4.87 -1.655,-3.73
  rectangle: -2.305,-5.58 -1.505,-5.07
  rectangle: -0.885,-4.87 -0.385,-3.73
  rectangle: -1.035,-5.58 -0.235,-5.07
  rectangle: 0.385,-4.87 0.885,-3.73
  rectangle: 0.235,-5.58 1.035,-5.07
  rectangle: 1.655,-4.87 2.155,-3.73
  rectangle: 1.505,-5.58 2.305,-5.07
  rectangle: 2.925,-4.87 3.425,-3.73
  rectangle: 2.775,-5.58 3.575,-5.07
  rectangle: 4.195,-4.87 4.695,-3.73
  rectangle: 4.045,-5.58 4.845,-5.07
  rectangle: 5.465,-4.87 5.965,-3.73
  rectangle: 5.315,-5.58 6.115,-5.07
  rectangle: 6.735,-4.87 7.235,-3.73
  rectangle: 6.585,-5.58 7.385,-5.07
  rectangle: 6.735,3.73 7.235,4.87
  rectangle: 6.585,5.07 7.385,5.58
  rectangle: 5.465,3.73 5.965,4.87
  rectangle: 5.315,5.07 6.115,5.58
  rectangle: 4.195,3.73 4.695,4.87
  rectangle: 4.045,5.07 4.845,5.58
  rectangle: 2.925,3.73 3.425,4.87
  rectangle: 2.775,5.07 3.575,5.58
  rectangle: 1.655,3.73 2.155,4.87
  rectangle: 1.505,5.07 2.305,5.58
  rectangle: 0.385,3.73 0.885,4.87
  rectangle: 0.235,5.07 1.035,5.58
  rectangle: -0.885,3.73 -0.385,4.87
  rectangle: -1.035,5.07 -0.235,5.58
  rectangle: -2.155,3.73 -1.655,4.87
  rectangle: -2.305,5.07 -1.505,5.58
  rectangle: -3.425,3.73 -2.925,4.87
  rectangle: -3.575,5.07 -2.775,5.58
  rectangle: -4.695,3.73 -4.195,4.87
  rectangle: -4.845,5.07 -4.045,5.58
  rectangle: -5.965,3.73 -5.465,4.87
  rectangle: -6.115,5.07 -5.315,5.58
  rectangle: -7.235,3.73 -6.735,4.87
  rectangle: -7.385,5.07 -6.585,5.58
  lines w0.203: -8.05,-4.97 8.04,-4.97 8.04,4.97 -8.05,4.97 -8.05,-4.97
Mechanical 27:
  lines w0.2: -8.4,-6.4 -8.4,6.4 8.4,6.4 8.4,-6.4 -8.4,-6.4

## SOJ24-35 [mm]
pads (24):
  rect 0.6x2.2 smd: 1(-6.985,-4.2) 2(-5.715,-4.2) 3(-4.445,-4.2) 4(-3.175,-4.2) 5(-1.905,-4.2) 6(-0.635,-4.2) 7(0.635,-4.2) 8(1.905,-4.2) 9(3.175,-4.2) 10(4.445,-4.2) 11(5.715,-4.2) 12(6.985,-4.2) 13(6.985,4.2) 14(5.715,4.2) 15(4.445,4.2) 16(3.175,4.2) 17(1.905,4.2) 18(0.635,4.2) 19(-0.635,4.2) 20(-1.905,4.2) 21(-3.175,4.2) 22(-4.445,4.2) 23(-5.715,4.2) 24(-6.985,4.2)
Top Overlay:
  text "1" at -6.44,-2.77 h1.97
Mechanical 16:
  rectangle: -7.235,-4.27 -6.735,-3.13
  rectangle: -7.385,-4.98 -6.585,-4.47
  rectangle: -5.965,-4.27 -5.465,-3.13
  rectangle: -6.115,-4.98 -5.315,-4.47
  rectangle: -4.695,-4.27 -4.195,-3.13
  rectangle: -4.845,-4.98 -4.045,-4.47
  rectangle: -3.425,-4.27 -2.925,-3.13
  rectangle: -3.575,-4.98 -2.775,-4.47
  rectangle: -2.155,-4.27 -1.655,-3.13
  rectangle: -2.305,-4.98 -1.505,-4.47
  rectangle: -0.885,-4.27 -0.385,-3.13
  rectangle: -1.035,-4.98 -0.235,-4.47
  rectangle: 0.385,-4.27 0.885,-3.13
  rectangle: 0.235,-4.98 1.035,-4.47
  rectangle: 1.655,-4.27 2.155,-3.13
  rectangle: 1.505,-4.98 2.305,-4.47
  rectangle: 2.925,-4.27 3.425,-3.13
  rectangle: 2.775,-4.98 3.575,-4.47
  rectangle: 4.195,-4.27 4.695,-3.13
  rectangle: 4.045,-4.98 4.845,-4.47
  rectangle: 5.465,-4.27 5.965,-3.13
  rectangle: 5.315,-4.98 6.115,-4.47
  rectangle: 6.735,-4.27 7.235,-3.13
  rectangle: 6.585,-4.98 7.385,-4.47
  rectangle: 6.735,3.13 7.235,4.27
  rectangle: 6.585,4.47 7.385,4.98
  rectangle: 5.465,3.13 5.965,4.27
  rectangle: 5.315,4.47 6.115,4.98
  rectangle: 4.195,3.13 4.695,4.27
  rectangle: 4.045,4.47 4.845,4.98
  rectangle: 2.925,3.13 3.425,4.27
  rectangle: 2.775,4.47 3.575,4.98
  rectangle: 1.655,3.13 2.155,4.27
  rectangle: 1.505,4.47 2.305,4.98
  rectangle: 0.385,3.13 0.885,4.27
  rectangle: 0.235,4.47 1.035,4.98
  rectangle: -0.885,3.13 -0.385,4.27
  rectangle: -1.035,4.47 -0.235,4.98
  rectangle: -2.155,3.13 -1.655,4.27
  rectangle: -2.305,4.47 -1.505,4.98
  rectangle: -3.425,3.13 -2.925,4.27
  rectangle: -3.575,4.47 -2.775,4.98
  rectangle: -4.695,3.13 -4.195,4.27
  rectangle: -4.845,4.47 -4.045,4.98
  rectangle: -5.965,3.13 -5.465,4.27
  rectangle: -6.115,4.47 -5.315,4.98
  rectangle: -7.235,3.13 -6.735,4.27
  rectangle: -7.385,4.47 -6.585,4.98
  lines w0.203: -8.05,-4.37 8.04,-4.37 8.04,4.37 -8.05,4.37 -8.05,-4.37
Mechanical 27:
  lines w0.2: -8.4,-5.9 -8.4,5.9 8.4,5.9 8.4,-5.9 -8.4,-5.9

## SOJ24-45 [mm]
pads (24):
  rect 0.6x2.2 smd: 1(-6.985,-5.5) 2(-5.715,-5.5) 3(-4.445,-5.5) 4(-3.175,-5.5) 5(-1.905,-5.5) 6(-0.635,-5.5) 7(0.635,-5.5) 8(1.905,-5.5) 9(3.175,-5.5) 10(4.445,-5.5) 11(5.715,-5.5) 12(6.985,-5.5) 13(6.985,5.5) 14(5.715,5.5) 15(4.445,5.5) 16(3.175,5.5) 17(1.905,5.5) 18(0.635,5.5) 19(-0.635,5.5) 20(-1.905,5.5) 21(-3.175,5.5) 22(-4.445,5.5) 23(-5.715,5.5) 24(-6.985,5.5)
Top Overlay:
  text "1" at -6.44,-4.07 h1.97
Mechanical 16:
  rectangle: -7.235,-5.57 -6.735,-4.43
  rectangle: -7.385,-6.28 -6.585,-5.77
  rectangle: -5.965,-5.57 -5.465,-4.43
  rectangle: -6.115,-6.28 -5.315,-5.77
  rectangle: -4.695,-5.57 -4.195,-4.43
  rectangle: -4.845,-6.28 -4.045,-5.77
  rectangle: -3.425,-5.57 -2.925,-4.43
  rectangle: -3.575,-6.28 -2.775,-5.77
  rectangle: -2.155,-5.57 -1.655,-4.43
  rectangle: -2.305,-6.28 -1.505,-5.77
  rectangle: -0.885,-5.57 -0.385,-4.43
  rectangle: -1.035,-6.28 -0.235,-5.77
  rectangle: 0.385,-5.57 0.885,-4.43
  rectangle: 0.235,-6.28 1.035,-5.77
  rectangle: 1.655,-5.57 2.155,-4.43
  rectangle: 1.505,-6.28 2.305,-5.77
  rectangle: 2.925,-5.57 3.425,-4.43
  rectangle: 2.775,-6.28 3.575,-5.77
  rectangle: 4.195,-5.57 4.695,-4.43
  rectangle: 4.045,-6.28 4.845,-5.77
  rectangle: 5.465,-5.57 5.965,-4.43
  rectangle: 5.315,-6.28 6.115,-5.77
  rectangle: 6.735,-5.57 7.235,-4.43
  rectangle: 6.585,-6.28 7.385,-5.77
  rectangle: 6.735,4.43 7.235,5.57
  rectangle: 6.585,5.77 7.385,6.28
  rectangle: 5.465,4.43 5.965,5.57
  rectangle: 5.315,5.77 6.115,6.28
  rectangle: 4.195,4.43 4.695,5.57
  rectangle: 4.045,5.77 4.845,6.28
  rectangle: 2.925,4.43 3.425,5.57
  rectangle: 2.775,5.77 3.575,6.28
  rectangle: 1.655,4.43 2.155,5.57
  rectangle: 1.505,5.77 2.305,6.28
  rectangle: 0.385,4.43 0.885,5.57
  rectangle: 0.235,5.77 1.035,6.28
  rectangle: -0.885,4.43 -0.385,5.57
  rectangle: -1.035,5.77 -0.235,6.28
  rectangle: -2.155,4.43 -1.655,5.57
  rectangle: -2.305,5.77 -1.505,6.28
  rectangle: -3.425,4.43 -2.925,5.57
  rectangle: -3.575,5.77 -2.775,6.28
  rectangle: -4.695,4.43 -4.195,5.57
  rectangle: -4.845,5.77 -4.045,6.28
  rectangle: -5.965,4.43 -5.465,5.57
  rectangle: -6.115,5.77 -5.315,6.28
  rectangle: -7.235,4.43 -6.735,5.57
  rectangle: -7.385,5.77 -6.585,6.28
  lines w0.203: -8.05,-5.67 8.04,-5.67 8.04,5.67 -8.05,5.67 -8.05,-5.67
Mechanical 27:
  lines w0.2: -8.4,-6.9 -8.4,6.9 8.4,6.9 8.4,-6.9 -8.4,-6.9

## SOJ26-3 [mm]
pads (26):
  rect 0.6x2.2 smd: 1(-7.62,-3.6) 2(-6.35,-3.6) 3(-5.08,-3.6) 4(-3.81,-3.6) 5(-2.54,-3.6) 6(-1.27,-3.6) 7(0,-3.6) 8(1.27,-3.6) 9(2.54,-3.6) 10(3.81,-3.6) 11(5.08,-3.6) 12(6.35,-3.6) 13(7.62,-3.6) 14(7.62,3.6) 15(6.35,3.6) 16(5.08,3.6) 17(3.81,3.6) 18(2.54,3.6) 19(1.27,3.6) 20(0,3.6) 21(-1.27,3.6) 22(-2.54,3.6) 23(-3.81,3.6) 24(-5.08,3.6) 25(-6.35,3.6) 26(-7.62,3.6)
Top Overlay:
  text "1" at -7.075,-2.17 h1.97
Mechanical 16:
  rectangle: -7.87,-3.67 -7.37,-2.53
  rectangle: -8.02,-4.38 -7.22,-3.87
  rectangle: -6.6,-3.67 -6.1,-2.53
  rectangle: -6.75,-4.38 -5.95,-3.87
  rectangle: -5.33,-3.67 -4.83,-2.53
  rectangle: -5.48,-4.38 -4.68,-3.87
  rectangle: -4.06,-3.67 -3.56,-2.53
  rectangle: -4.21,-4.38 -3.41,-3.87
  rectangle: -2.79,-3.67 -2.29,-2.53
  rectangle: -2.94,-4.38 -2.14,-3.87
  rectangle: -1.52,-3.67 -1.02,-2.53
  rectangle: -1.67,-4.38 -0.87,-3.87
  rectangle: -0.25,-3.67 0.25,-2.53
  rectangle: -0.4,-4.38 0.4,-3.87
  rectangle: 1.02,-3.67 1.52,-2.53
  rectangle: 0.87,-4.38 1.67,-3.87
  rectangle: 2.29,-3.67 2.79,-2.53
  rectangle: 2.14,-4.38 2.94,-3.87
  rectangle: 3.56,-3.67 4.06,-2.53
  rectangle: 3.41,-4.38 4.21,-3.87
  rectangle: 4.83,-3.67 5.33,-2.53
  rectangle: 4.68,-4.38 5.48,-3.87
  rectangle: 6.1,-3.67 6.6,-2.53
  rectangle: 5.95,-4.38 6.75,-3.87
  rectangle: 7.37,-3.67 7.87,-2.53
  rectangle: 7.22,-4.38 8.02,-3.87
  rectangle: 7.37,2.53 7.87,3.67
  rectangle: 7.22,3.87 8.02,4.38
  rectangle: 6.1,2.53 6.6,3.67
  rectangle: 5.95,3.87 6.75,4.38
  rectangle: 4.83,2.53 5.33,3.67
  rectangle: 4.68,3.87 5.48,4.38
  rectangle: 3.56,2.53 4.06,3.67
  rectangle: 3.41,3.87 4.21,4.38
  rectangle: 2.29,2.53 2.79,3.67
  rectangle: 2.14,3.87 2.94,4.38
  rectangle: 1.02,2.53 1.52,3.67
  rectangle: 0.87,3.87 1.67,4.38
  rectangle: -0.25,2.53 0.25,3.67
  rectangle: -0.4,3.87 0.4,4.38
  rectangle: -1.52,2.53 -1.02,3.67
  rectangle: -1.67,3.87 -0.87,4.38
  rectangle: -2.79,2.53 -2.29,3.67
  rectangle: -2.94,3.87 -2.14,4.38
  rectangle: -4.06,2.53 -3.56,3.67
  rectangle: -4.21,3.87 -3.41,4.38
  rectangle: -5.33,2.53 -4.83,3.67
  rectangle: -5.48,3.87 -4.68,4.38
  rectangle: -6.6,2.53 -6.1,3.67
  rectangle: -6.75,3.87 -5.95,4.38
  rectangle: -7.87,2.53 -7.37,3.67
  rectangle: -8.02,3.87 -7.22,4.38
  lines w0.203: -8.685,-3.77 8.675,-3.77 8.675,3.77 -8.685,3.77 -8.685,-3.77
Mechanical 27:
  lines w0.2: -8.9,-4.9 -8.9,4.9 8.9,4.9 8.9,-4.9 -8.9,-4.9

## SOJ26-4 [mm]
pads (26):
  rect 0.6x2.2 smd: 1(-7.62,-4.8) 2(-6.35,-4.8) 3(-5.08,-4.8) 4(-3.81,-4.8) 5(-2.54,-4.8) 6(-1.27,-4.8) 7(0,-4.8) 8(1.27,-4.8) 9(2.54,-4.8) 10(3.81,-4.8) 11(5.08,-4.8) 12(6.35,-4.8) 13(7.62,-4.8) 14(7.62,4.8) 15(6.35,4.8) 16(5.08,4.8) 17(3.81,4.8) 18(2.54,4.8) 19(1.27,4.8) 20(0,4.8) 21(-1.27,4.8) 22(-2.54,4.8) 23(-3.81,4.8) 24(-5.08,4.8) 25(-6.35,4.8) 26(-7.62,4.8)
Top Overlay:
  text "1" at -7.075,-3.37 h1.97
Mechanical 16:
  rectangle: -7.87,-4.87 -7.37,-3.73
  rectangle: -8.02,-5.58 -7.22,-5.07
  rectangle: -6.6,-4.87 -6.1,-3.73
  rectangle: -6.75,-5.58 -5.95,-5.07
  rectangle: -5.33,-4.87 -4.83,-3.73
  rectangle: -5.48,-5.58 -4.68,-5.07
  rectangle: -4.06,-4.87 -3.56,-3.73
  rectangle: -4.21,-5.58 -3.41,-5.07
  rectangle: -2.79,-4.87 -2.29,-3.73
  rectangle: -2.94,-5.58 -2.14,-5.07
  rectangle: -1.52,-4.87 -1.02,-3.73
  rectangle: -1.67,-5.58 -0.87,-5.07
  rectangle: -0.25,-4.87 0.25,-3.73
  rectangle: -0.4,-5.58 0.4,-5.07
  rectangle: 1.02,-4.87 1.52,-3.73
  rectangle: 0.87,-5.58 1.67,-5.07
  rectangle: 2.29,-4.87 2.79,-3.73
  rectangle: 2.14,-5.58 2.94,-5.07
  rectangle: 3.56,-4.87 4.06,-3.73
  rectangle: 3.41,-5.58 4.21,-5.07
  rectangle: 4.83,-4.87 5.33,-3.73
  rectangle: 4.68,-5.58 5.48,-5.07
  rectangle: 6.1,-4.87 6.6,-3.73
  rectangle: 5.95,-5.58 6.75,-5.07
  rectangle: 7.37,-4.87 7.87,-3.73
  rectangle: 7.22,-5.58 8.02,-5.07
  rectangle: 7.37,3.73 7.87,4.87
  rectangle: 7.22,5.07 8.02,5.58
  rectangle: 6.1,3.73 6.6,4.87
  rectangle: 5.95,5.07 6.75,5.58
  rectangle: 4.83,3.73 5.33,4.87
  rectangle: 4.68,5.07 5.48,5.58
  rectangle: 3.56,3.73 4.06,4.87
  rectangle: 3.41,5.07 4.21,5.58
  rectangle: 2.29,3.73 2.79,4.87
  rectangle: 2.14,5.07 2.94,5.58
  rectangle: 1.02,3.73 1.52,4.87
  rectangle: 0.87,5.07 1.67,5.58
  rectangle: -0.25,3.73 0.25,4.87
  rectangle: -0.4,5.07 0.4,5.58
  rectangle: -1.52,3.73 -1.02,4.87
  rectangle: -1.67,5.07 -0.87,5.58
  rectangle: -2.79,3.73 -2.29,4.87
  rectangle: -2.94,5.07 -2.14,5.58
  rectangle: -4.06,3.73 -3.56,4.87
  rectangle: -4.21,5.07 -3.41,5.58
  rectangle: -5.33,3.73 -4.83,4.87
  rectangle: -5.48,5.07 -4.68,5.58
  rectangle: -6.6,3.73 -6.1,4.87
  rectangle: -6.75,5.07 -5.95,5.58
  rectangle: -7.87,3.73 -7.37,4.87
  rectangle: -8.02,5.07 -7.22,5.58
  lines w0.203: -8.685,-4.97 8.675,-4.97 8.675,4.97 -8.685,4.97 -8.685,-4.97
Mechanical 27:
  lines w0.2: -8.9,-6.4 -8.9,6.4 8.9,6.4 8.9,-6.4 -8.9,-6.4